# Altium footprint library MH_DA_THU_VIEN_16122016.PcbLib: 531 footprints (part 20 of 34)
Each footprint in its own frame and in the unit in brackets; x right, y up, seen from the top. Pads: shape width x height; smd on the part's side, far side on the other; paste and mask are expansions set on the pad; w line width, h text height; cw(c..) or ccw(c..) is an arc to the next point about the centre after c.
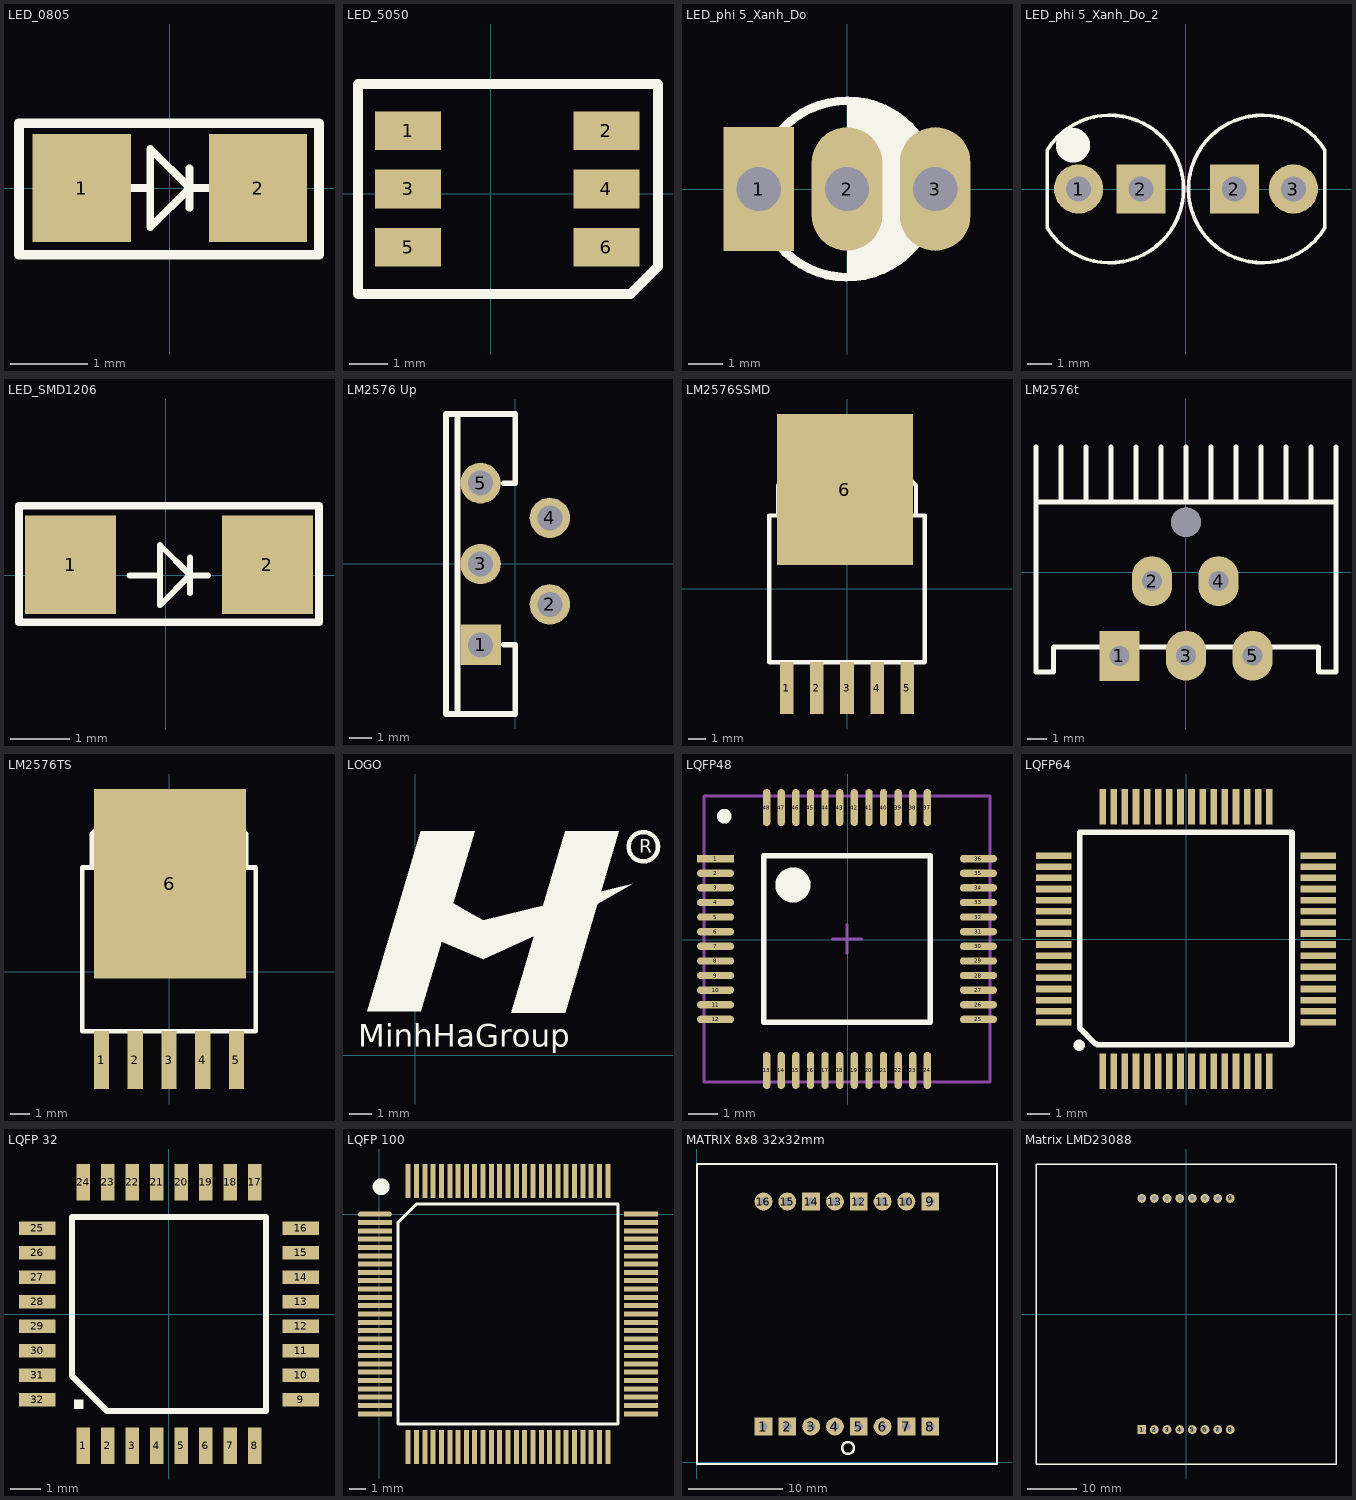
[diagram p19: the footprints below, top view; thin cyan lines are the x and y axes]

## LED_0805 [mil]
pads (2):
  rect 50x55 smd: 1(-45,0) 2(45,0)
Top Overlay:
  lines w3.94: -20,0 -10,0 ; 10,-10 10,10 ; 20,0 10,0 ; 10,0 -10,20 -10,-20 10,0
  lines w5: -77,-34 -77,33 76,33 76,-34 -77,-34
3D body: height 33.45, standoff 0.23, extent -40.6,-15.68 40.6,20

## LED_5050 [mm]
pads (6):
  rect 1.7x1 smd: 1(-2.122,1.627) 2(2.978,1.627) 3(-2.122,0.127) 4(2.978,0.127) 5(-2.122,-1.373) 6(2.978,-1.373)
Top Overlay:
  lines w0.254: -3.413,-2.573 -3.413,2.827 4.308,2.827 4.308,-1.865 3.6,-2.573 -3.413,-2.573
3D body: height 1.6, standoff 0, extent -2.372,-2.375 2.928,2.625

## LED_phi 5_Xanh_Do [mil] "LED phi 5mm 2 mau xanh va do"
height 314.96
pads (3):
  rect 80x140 hole 50: 1(-100,0)
  oval 80x140 hole 50: 2(0,0) 3(100,0)
Top Overlay:
  region: 0,100 7,93 27,93
  region: 0,100 0,-100 25,-100 35,-90 50,-90 87.62,-52.38 87.62,45.71 88.49,46.58 88.49,51.51 70.71,69.29 70.71,70.71 69.29,70.71 47,93 7,93
  lines w10: 0,100 cw(c0,0) 70.71,70.71 ; 87.62,-48.19 cw(c0,0) 88.49,46.58 88.49,-47.32

## LED_phi 5_Xanh_Do_2 [mm] "LED phi 5mm 2 mau xanh va do doc lap"
height 8
pads (4):
  round 2 hole 1: 1(-4.37,0) 3(4.37,0)
  rect 2x2 hole 1: 2(-1.83,0) 2(1.97,0)
Top Overlay:
  circle w1: c-4.594,1.778 r0.2
  lines w0.15: -5.64,-1.6 -5.64,1.575 ; -5.638,-1.599 ccw(c-3.1,0) -5.638,1.599 ; 5.638,-1.575 5.638,1.6 ; 5.638,-1.599 cw(c3.1,0) 5.638,1.599

## LED_SMD1206 [mil]
pads (2):
  rect 60x65 smd: 1(-63,7) 2(67,7)
Top Overlay:
  lines w3.94: -23.94,0 -3.94,0 ; 15.75,-11.81 15.75,11.81 ; 15.75,0 -3.94,-19.68 -3.94,20 16.06,0 27.87,0
  lines w5: -97,-31 101,-31 101,46 -97,46 -97,-31
3D body: height 43.31, standoff 0, extent -62.99,-23.62 62.99,39.37

## LM2576 Up [mil] "IC nguon LM2576"
pads (5):
  rect 70x70 hole 43.31: 1(-60,-140)
  round 70 hole 43.31: 2(60,-70) 3(-60,0) 4(60,80) 5(-60,140)
Top Overlay:
  lines w10: -100,-260 -100,260 ; -20,-140 0,-140 0,-260 -120,-260 -120,260 0,260 0,140 -20,140

## LM2576SSMD [mil]
pads (6):
  rect 31.5x120 smd: 1(-140,-230) 2(-70,-230) 3(0,-230) 4(70,-230) 5(140,-230)
  rect 314.96x350 smd: 6(-5,230)
Top Overlay:
  lines w10: -160,170 -160,240 -140,260 140,260 160,240 160,170 ; -180,-170 -180,170 180,170 180,-170 -180,-170
3D body: height 180.12, standoff 0.6, extent -200,-241.79 200,309.98

## LM2576t [mil]
pads (6):
  rect 80x100 hole 40: 1(-132,-167.09)
  oval 80x100 hole 40: 2(-67,-18) 3(1,-167) 4(66,-18) 5(134,-167)
  round 59.06 hole 59.06: ""(1,100)
Top Overlay:
  lines w10: -299,140 301,140 ; -299,250 -299,-200 -264,-200 -264,-150 266,-150 266,-200 301,-200 301,250 ; -249,140 -249,250 ; -199,140 -199,250 ; -149,140 -149,250 ; -99,140 -99,250 ; -49,140 -49,250 ; 1,140 1,250 ; 51,140 51,250 ; 101,140 101,250 ; 151,140 151,250 ; 201,140 201,250 ; 251,140 251,250
3D body: height 859.05, standoff -85.43, extent -199,-174.91 201,149.5

## LM2576TS [mil]
pads (6):
  rect 31.5x120 smd: 1(-140,-183) 2(-70,-183) 3(0,-183) 4(70,-183) 5(140,-183)
  rect 314.96x393.7 smd: 6(2,183)
Top Overlay:
  lines w10: -160,217 -160,287 -140,307 140,307 160,287 160,217 ; -180,-123 -180,217 180,217 180,-123 -180,-123
3D body: height 180.03, standoff 0.5, extent -199,-196.79 201,354.98

## LOGO [mm]
Top Overlay:
  circle w0.203: c10.236,9.347 r0.66
  region: 3.048,4.299 5.41,5.366 6.883,6.052 9.754,7.696 3.048,6.045
  region: 1.702,6.807 2.413,6.401 3.048,6.045 3.048,4.293 1.041,5.156 1.448,6.02
  region: 9.144,10.033 6.731,10.033 6.731,1.905
  region: 4.318,1.905 6.731,1.905 6.731,10.033
  region: -2.159,1.956 0.254,1.956 0.254,10.033
  region: 2.667,10.033 0.254,10.033 0.254,1.956
  text "MinhHaGroup" at -2.565,0.381 h1.02
  text "R" at 10.058,9.068 h0.61

## LQFP48 [mm]
pads (48):
  rect 1.27x0.25 smd: 1(-4.524,2.775)
  oval 1.27x0.25 smd: 2(-4.524,2.275) 3(-4.524,1.775) 4(-4.524,1.275) 5(-4.524,0.775) 6(-4.524,0.275) 7(-4.524,-0.225) 8(-4.524,-0.725) 9(-4.524,-1.225) 10(-4.524,-1.725) 11(-4.524,-2.225) 12(-4.524,-2.725) 25(4.473,-2.725) 26(4.473,-2.225) 27(4.473,-1.725) 28(4.473,-1.225) 29(4.473,-0.725) 30(4.473,-0.225) 31(4.473,0.275) 32(4.473,0.775) 33(4.473,1.275) 34(4.473,1.775) 35(4.473,2.275) 36(4.473,2.775)
  oval 0.25x1.27 smd: 13(-2.775,-4.473) 14(-2.275,-4.473) 15(-1.775,-4.473) 16(-1.275,-4.473) 17(-0.775,-4.473) 18(-0.275,-4.473) 19(0.225,-4.473) 20(0.725,-4.473) 21(1.225,-4.473) 22(1.725,-4.473) 23(2.225,-4.473) 24(2.725,-4.473) 37(2.725,4.524) 38(2.225,4.524) 39(1.725,4.524) 40(1.225,4.524) 41(0.725,4.524) 42(0.225,4.524) 43(-0.275,4.524) 44(-0.775,4.524) 45(-1.275,4.524) 46(-1.775,4.524) 47(-2.275,4.524) 48(-2.775,4.524)
Top Overlay:
  circle w0.25: c-4.225,4.225 r0.125
  circle w0.6: c-1.875,1.875 r0.3
  lines w0.2: -2.875,-2.825 -2.875,2.875 2.825,2.875 2.825,-2.825 -2.875,-2.825
Mechanical 15:
  lines w0.1: -0.525,0.025 0.475,0.025 ; -0.025,-0.475 -0.025,0.525 ; -4.925,-4.875 -4.925,4.925 4.875,4.925 4.875,-4.875 -4.925,-4.875
3D body: height 1.5, standoff 0, extent -4.525,-4.475 4.475,4.525

## LQFP64 [mm] "LQFP64"
pads (64):
  rect 0.3x1.6 smd: 1(-3.75,-5.95) 2(-3.25,-5.95) 3(-2.75,-5.95) 4(-2.25,-5.95) 5(-1.75,-5.95) 6(-1.25,-5.95) 7(-0.75,-5.95) 8(-0.25,-5.95) 9(0.25,-5.95) 10(0.75,-5.95) 11(1.25,-5.95) 12(1.75,-5.95) 13(2.25,-5.95) 14(2.75,-5.95) 15(3.25,-5.95) 16(3.75,-5.95) 33(3.75,5.95) 34(3.25,5.95) 35(2.75,5.95) 36(2.25,5.95) 37(1.75,5.95) 38(1.25,5.95) 39(0.75,5.95) 40(0.25,5.95) 41(-0.25,5.95) 42(-0.75,5.95) 43(-1.25,5.95) 44(-1.75,5.95) 45(-2.25,5.95) 46(-2.75,5.95) 47(-3.25,5.95) 48(-3.75,5.95)
  rect 1.6x0.3 smd: 17(5.95,-3.75) 18(5.95,-3.25) 19(5.95,-2.75) 20(5.95,-2.25) 21(5.95,-1.75) 22(5.95,-1.25) 23(5.95,-0.75) 24(5.95,-0.25) 25(5.95,0.25) 26(5.95,0.75) 27(5.95,1.25) 28(5.95,1.75) 29(5.95,2.25) 30(5.95,2.75) 31(5.95,3.25) 32(5.95,3.75) 49(-5.95,3.75) 50(-5.95,3.25) 51(-5.95,2.75) 52(-5.95,2.25) 53(-5.95,1.75) 54(-5.95,1.25) 55(-5.95,0.75) 56(-5.95,0.25) 57(-5.95,-0.25) 58(-5.95,-0.75) 59(-5.95,-1.25) 60(-5.95,-1.75) 61(-5.95,-2.25) 62(-5.95,-2.75) 63(-5.95,-3.25) 64(-5.95,-3.75)
Top Overlay:
  lines w0.254: -4.779,4.639 -4.779,4.804 4.67,4.804 4.759,4.804 4.772,4.791 4.772,-4.721 4.734,-4.759 -3.991,-4.759 ; -4.779,4.778 -4.779,-4.01 -4.068,-4.721 -4.042,-4.721
  lines w0.508: -4.817,-4.785 -4.804,-4.785
3D body: height 1.46, standoff -0.14, extent -6.016,-6.004 5.984,5.996

## LQFP 32 [mm]
pads (32):
  rect 0.45x1.2 smd: 1(-2.8,-4.3) 2(-2,-4.3) 3(-1.2,-4.3) 4(-0.4,-4.3) 5(0.4,-4.3) 6(1.2,-4.3) 7(2,-4.3) 8(2.8,-4.3) 17(2.8,4.3) 18(2,4.3) 19(1.2,4.3) 20(0.4,4.3) 21(-0.4,4.3) 22(-1.2,4.3) 23(-2,4.3) 24(-2.8,4.3)
  rect 1.2x0.45 smd: 9(4.3,-2.8) 10(4.3,-2) 11(4.3,-1.2) 12(4.3,-0.4) 13(4.3,0.4) 14(4.3,1.2) 15(4.3,2) 16(4.3,2.8) 25(-4.3,2.8) 26(-4.3,2) 27(-4.3,1.2) 28(-4.3,0.4) 29(-4.3,-0.4) 30(-4.3,-1.2) 31(-4.3,-2) 32(-4.3,-2.8)
Top Overlay:
  region: -2.8,-3.1 -2.8,-2.8 -3.1,-2.8 -3.1,-3.1
  lines w0.2: -3.165,-2.03 -2.03,-3.165 3.165,-3.165 3.165,3.165 -3.165,3.165 -3.165,-2.03

## LQFP 100 [mm]
pads (100):
  oval 2.032x0.3 smd: 1(-0.25,0)
  rect 2.032x0.3 smd: 2(-0.25,-0.5) 3(-0.25,-1) 4(-0.25,-1.5) 5(-0.25,-2) 6(-0.25,-2.5) 7(-0.25,-3) 8(-0.25,-3.5) 9(-0.25,-4) 10(-0.25,-4.5) 11(-0.25,-5) 12(-0.25,-5.5) 13(-0.25,-6) 14(-0.25,-6.5) 15(-0.25,-7) 16(-0.25,-7.5) 17(-0.25,-8) 18(-0.25,-8.5) 19(-0.25,-9) 20(-0.25,-9.5) 21(-0.25,-10) 22(-0.25,-10.5) 23(-0.25,-11) 24(-0.25,-11.5) 25(-0.25,-12) 51(15.75,-12) 52(15.75,-11.5) 53(15.75,-11) 54(15.75,-10.5) 55(15.75,-10) 56(15.75,-9.5) 57(15.75,-9) 58(15.75,-8.5) 59(15.75,-8) 60(15.75,-7.5) 61(15.75,-7) 62(15.75,-6.5) 63(15.75,-6) 64(15.75,-5.5) 65(15.75,-5) 66(15.75,-4.5) 67(15.75,-4) 68(15.75,-3.5) 69(15.75,-3) 70(15.75,-2.5) 71(15.75,-2) 72(15.75,-1.5) 73(15.75,-1) 74(15.75,-0.5) 75(15.75,0)
  rect 0.3x2.032 smd: 26(1.75,-14) 27(2.25,-14) 28(2.75,-14) 29(3.25,-14) 30(3.75,-14) 31(4.25,-14) 32(4.75,-14) 33(5.25,-14) 34(5.75,-14) 35(6.25,-14) 36(6.75,-14) 37(7.25,-14) 38(7.75,-14) 39(8.25,-14) 40(8.75,-14) 41(9.25,-14) 42(9.75,-14) 43(10.25,-14) 44(10.75,-14) 45(11.25,-14) 46(11.75,-14) 47(12.25,-14) 48(12.75,-14) 49(13.25,-14) 50(13.75,-14) 76(13.75,2) 77(13.25,2) 78(12.75,2) 79(12.25,2) 80(11.75,2) 81(11.25,2) 82(10.75,2) 83(10.25,2) 84(9.75,2) 85(9.25,2) 86(8.75,2) 87(8.25,2) 88(7.75,2) 89(7.25,2) 90(6.75,2) 91(6.25,2) 92(5.75,2) 93(5.25,2) 94(4.75,2) 95(4.25,2) 96(3.75,2) 97(3.25,2) 98(2.75,2) 99(2.25,2) 100(1.75,2)
Top Overlay:
  circle w0.508: c0.127,1.651 r0.254
  lines w0.2: 1.135,-12.615 14.365,-12.615 14.365,0.615 2.27,0.615 1.135,-0.52 1.135,-12.615
3D body: height 1.6, standoff 0, extent -0.228,-13.994 15.772,2.006

## MATRIX 8x8 32x32mm [mil]
pads (16):
  rect 75x75 hole 35: 1(280,150) 2(380,150) 5(680,150) 7(880,150) 8(980,150) 9(980,1095) 12(680,1095) 14(480,1095)
  round 75 hole 35: 3(480,150) 4(580,150) 6(780,150) 10(880,1095) 11(780,1095) 13(580,1095) 15(380,1095) 16(280,1095)
Top Overlay:
  circle w10: c635,60 r25
  lines w10: 0.75,-7.34 1260.59,-7.34 1260.59,1252.51 0.75,1252.51 0.75,-7.34

## Matrix LMD23088 [mil] "Matrix 8x8"
pads (16):
  rect 70x70 hole 35: 1(-350,-913.39)
  round 70 hole 35: 2(-250,-913.39) 3(-150,-913.39) 4(-50,-913.39) 5(50,-913.39) 6(150,-913.39) 7(250,-913.39) 8(350,-913.39) 9(350,913.39) 10(250,913.39) 11(150,913.39) 12(50,913.39) 13(-50,913.39) 14(-150,913.39) 15(-250,913.39) 16(-350,913.39)
Top Overlay:
  lines w10: -1185.04,-1185.04 -1185.04,1185.04 1185.04,1185.04 1185.04,-1185.04 -1185.04,-1185.04